# Altium footprint library PCB_ConnectorHDR.PcbLib: 221 footprints (part 2 of 14)
Each footprint in its own frame and in the unit in brackets; x right, y up, seen from the top. Pads: shape width x height; smd on the part's side, far side on the other; paste and mask are expansions set on the pad; w line width, h text height; cw(c..) or ccw(c..) is an arc to the next point about the centre after c.
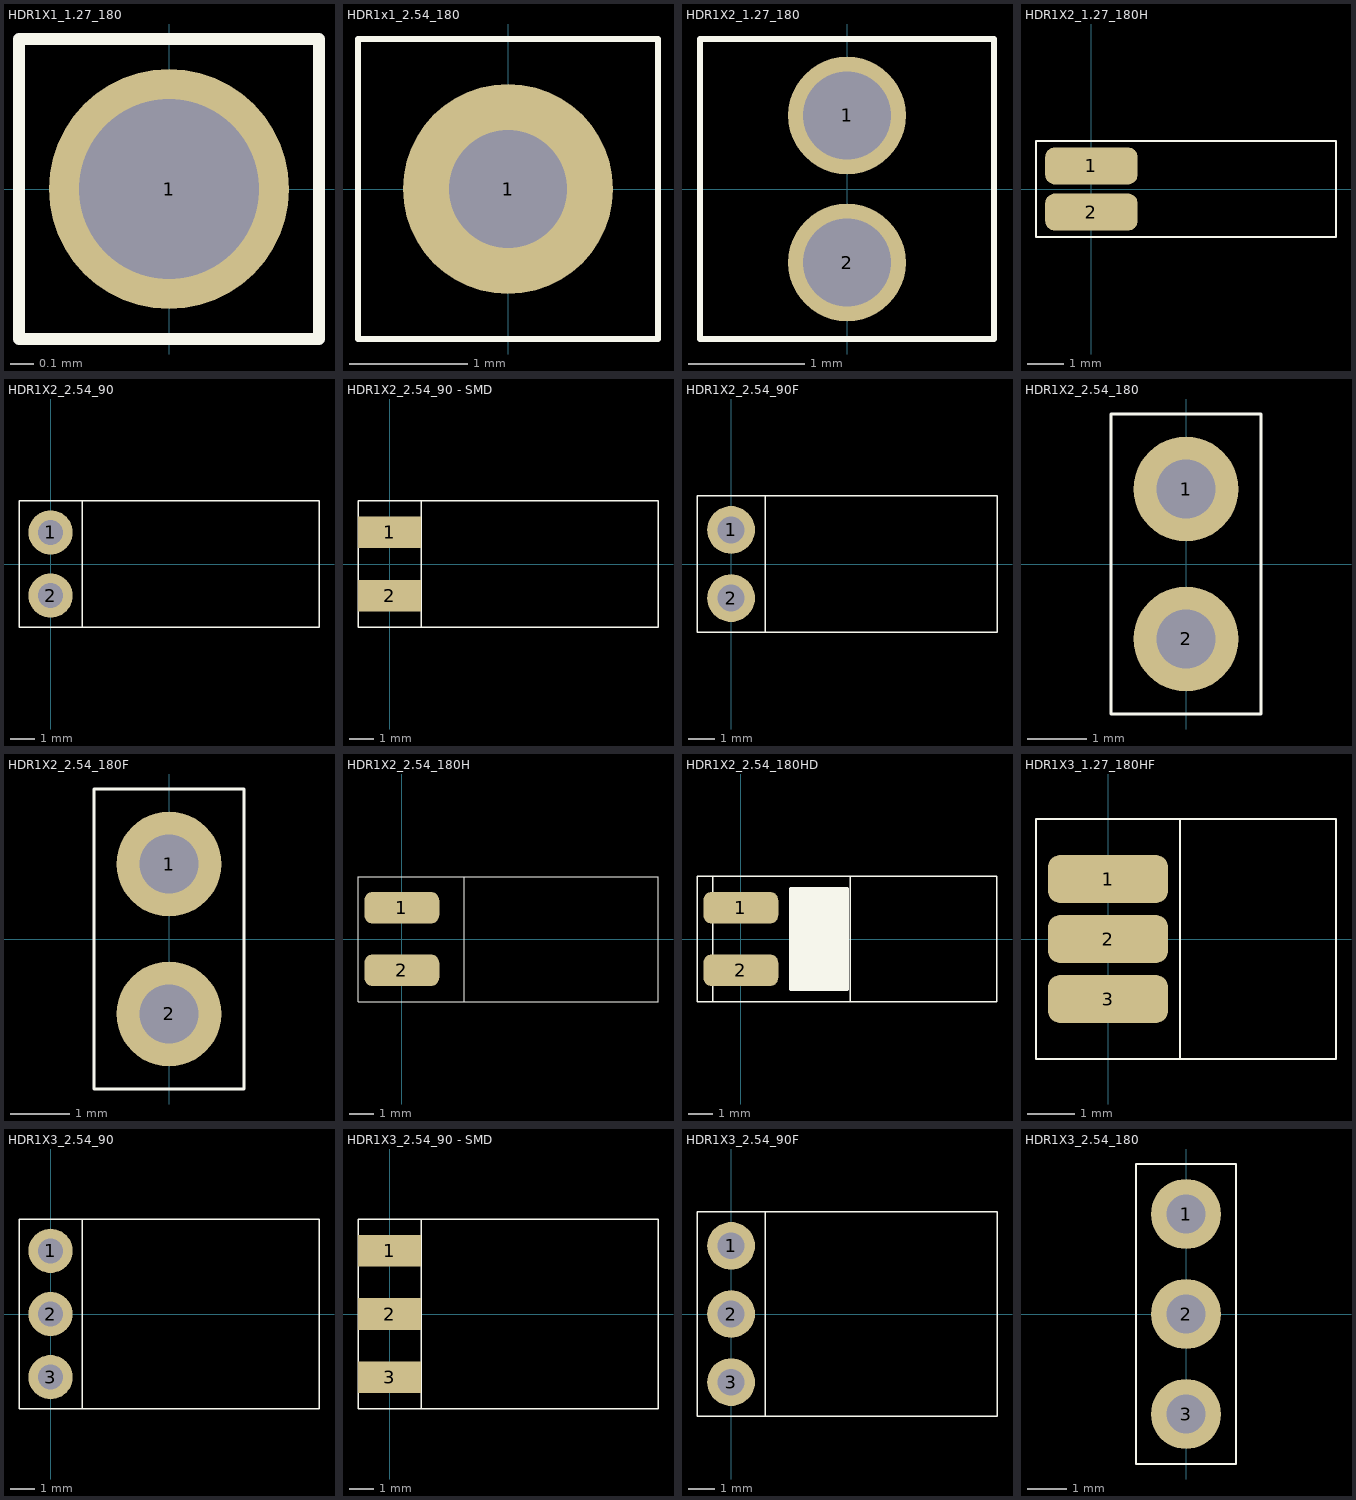
[diagram p1: the footprints below, top view; thin cyan lines are the x and y axes]

## HDR1X1_1.27_180 [mil]
height 169.29
pads (1):
  round 40 hole 30: 1(0,0)
Top Overlay:
  lines w2: -25,-25 -25,25 ; -25,-25 25,-25 ; -25,-25 25,-25 ; -25,-25 -25,25 ; -25,25 25,25 ; -25,25 25,25 ; 25,-25 25,25 ; 25,-25 25,25

## HDR1x1_2.54_180 [mil]
height 169.29
pads (1):
  round 70 hole 39.37: 1(0,0)
Top Overlay:
  lines w2: -50,-50 50,-50 ; -50,-50 -50,50 ; -50,-50 50,-50 ; -50,-50 -50,50 ; -50,50 50,50 ; -50,50 50,50 ; 50,-50 50,50 ; 50,-50 50,50

## HDR1X2_1.27_180 [mil]
height 169.29
pads (2):
  round 40 hole 30: 1(0,25) 2(0,-25)
Top Overlay:
  lines w2: -50,-51 -50,51 ; -50,-51 50,-51 ; -50,-51 -50,51 ; -50,-51 50,-51 ; -50,51 50,51 ; -50,51 50,51 ; 50,-51 50,51 ; 50,-51 50,51
3D body "pin_header_a-sl127-eg-g02d.stp": height 210.24, standoff -102.36, extent -49.21,-49.99 49.21,50.01

## HDR1X2_1.27_180H [mil]
height 169.29
pads (2):
  rrect50% 100x40 smd: 1(0,25) 2(0,-25)
Top Overlay:
  lines w2: -60,-52 -60,52 ; -60,-52 265,-52 265,52 -60,52 ; -60,-52 -60,52
3D body "pin_header_a-sl127-eg-g02d.stp": height 49.21, standoff -49.21, extent -47.36,-49.99 265.24,50.01

## HDR1X2_2.54_90 [mil]
height 169.29
pads (2):
  round 70 hole 39.37: 1(0,50) 2(0,-50)
Top Overlay:
  lines w2: -50,-100 50,-100 50,100 -50,100 ; -50,-100 -50,100 ; -50,-100 -50,100 ; -50,-100 425,-100 425,100 -50,100
3D body "pin_header_aw140-ea-g02g.stp": height 99.21, standoff -93.7, extent -15,-96.06 423.58,96.06

## HDR1X2_2.54_90 - SMD [mil]
height 169.29
pads (2):
  rect 100x50 smd: 1(0,50) 2(0,-50)
Top Overlay:
  lines w2: -50,-100 -50,100 ; -50,-100 425,-100 425,100 -50,100 ; -50,-100 50,-100 50,100 -50,100 ; -50,-100 -50,100
3D body "pin_header_a-sl254-ea-z02mp1.stp": height 98.93, standoff 0.5, extent -28.11,-99.99 424.64,100.01

## HDR1X2_2.54_90F [mil]
height 169.29
pads (2):
  round 70 hole 39.37: 1(0,50) 2(0,-50)
Top Overlay:
  lines w2: -50,-100 50,-100 50,100 -50,100 ; -50,-100 -50,100 ; -50,-100 390,-100 390,100 -50,100 ; -50,-100 -50,100
3D body "female_header_a-bl254-ea-g02d.stp": height 99.21, standoff -125.2, extent -10,-104.92 386.06,104.92

## HDR1X2_2.54_180 [mil]
height 169.29
pads (2):
  round 70 hole 39.37: 1(0,50) 2(0,-50)
Top Overlay:
  lines w2: -50,-100 50,-100 ; -50,-100 -50,100 ; -50,-100 50,-100 ; -50,-100 -50,100 ; -50,100 50,100 ; -50,100 50,100 ; 50,-100 50,100 ; 50,-100 50,100
3D body "pin_header_aw140-eg-g02d.stp": height 322.83, standoff -118.11, extent -49.36,-101 49,99

## HDR1X2_2.54_180F [mil]
height 169.29
pads (2):
  round 70 hole 39.37: 1(0,50) 2(0,-50)
Top Overlay:
  lines w2: -50,-100 -50,100 ; -50,-100 50,-100 ; -50,-100 50,-100 ; -50,-100 -50,100 ; -50,100 50,100 ; -50,100 50,100 ; 50,-100 50,100 ; 50,-100 50,100
3D body "female_header_a-bl254-eg-g02d.stp": height 334.65, standoff -125.98, extent -49.21,-104.92 49.22,104.92

## HDR1X2_2.54_180H [mil]
height 169.29
pads (2):
  rrect50% 120x50 smd: 1(0,50) 2(0,-50)
Top Overlay:
  lines w2: -70,-100 410,-100 410,100 -70,100 ; -70,-100 -70,100 ; -70,-100 -70,100 ; -70,-100 100,-100 100,100 -70,100
3D body "pin_header_aw140-eg-g02d.stp": height 61.32, standoff -37.05, extent -35,-100 405.94,100

## HDR1X2_2.54_180HD [mil]
height 169.29
pads (2):
  rrect50% 120x50 smd: 1(0,50) 2(0,-50)
Top Overlay:
  region: 80,80 170,80 170,-80 80,-80
  lines w2: -70,-100 -70,100 175,100 175,-100 -70,-100 ; -45,-100 409.65,-100 409.65,100 -45,100 -45,-100
  lines w6: 80,-80 170,-80 170,80 80,80 80,-80
3D body "pin_header_aw140-eg-g02d.stp": height 101.32, standoff 2.95, extent -45.47,-100 395.47,100

## HDR1X3_1.27_180HF [mil]
height 169.29
pads (3):
  rrect50% 100x40 smd: 1(0,50) 2(0,0) 3(0,-50)
Top Overlay:
  lines w2: -60,-100 60,-100 60,100 -60,100 ; -60,-100 -60,100 ; -60,-100 -60,100 ; -60,-100 190,-100 190,100 -60,100
3D body "female_header_a-bl127-eg-g03d.stp": height 35.43, standoff -35.43, extent -38.35,-82.87 190,82.88

## HDR1X3_2.54_90 [mil]
height 169.29
pads (3):
  round 70 hole 39.37: 1(0,100) 2(0,0) 3(0,-100)
Top Overlay:
  lines w2: -50,-150 -50,150 ; -50,-150 425,-150 425,150 -50,150 ; -50,-150 50,-150 50,150 -50,150 ; -50,-150 -50,150
3D body "pin_header_aw140-ea-g03g.stp": height 99.21, standoff -93.7, extent -15,-146.06 423.58,146.06

## HDR1X3_2.54_90 - SMD [mil]
height 169.29
pads (3):
  rect 100x50 smd: 1(0,100) 2(0,0) 3(0,-100)
Top Overlay:
  lines w2: -50,-150 -50,150 ; -50,-150 50,-150 50,150 -50,150 ; -50,-150 425,-150 425,150 -50,150 ; -50,-150 -50,150
3D body "pin_header_a-sl254-ea-z03mp1.stp": height 98.93, standoff 0.5, extent -29.11,-149.99 423.65,150.01

## HDR1X3_2.54_90F [mil]
height 169.29
pads (3):
  round 70 hole 39.37: 1(0,100) 2(0,0) 3(0,-100)
Top Overlay:
  lines w2: -50,-150 390,-150 390,150 -50,150 ; -50,-150 -50,150 ; -50,-150 -50,150 ; -50,-150 50,-150 50,150 -50,150
3D body "female_header_a-bl254-ea-g03d.stp": height 99.21, standoff -125.2, extent -10,-154.92 386.06,154.92

## HDR1X3_2.54_180 [mil]
height 169.29
pads (3):
  round 70 hole 39.37: 1(0,100) 2(0,0) 3(0,-100)
Top Overlay:
  lines w2: -50,-150 50,-150 ; -50,-150 -50,150 ; -50,-150 50,-150 ; -50,-150 -50,150 ; -50,150 50,150 ; -50,150 50,150 ; 50,-150 50,150 ; 50,-150 50,150
3D body "pin_header_aw140-eg-g03d.stp": height 322.83, standoff -118.11, extent -49.18,-150 49.18,150